# Altium integrated library Integrated_jp.IntLib: 316 symbols (part 2 of 3) (continued)
## REG_LM2576HVSX-12
designator U?, comment LM2576HVSX-12
Reductor Reguladores de conmutación IC Positivo Fija 12V 1 Salida 3A TO-263-6, D2PAK (5 conductores + pestaña), TO-263CA; Digi_Key_Part_Number: 296-35394-1-ND; Price: 7,26; Link: https://www.digikey.com/es/products/detail/texas-instruments/LM2576HVSX-12-NOPB/366785; LCSC Part: C18197844; Price JLCPCB: 0,92; Mouser Part: 926-LM2576HVSX12NOPB; ComponentLink1Description: IC REG BUCK 12V 3A TO263; ComponentLink1URL: https://www.digikey.com/es/products/detail/texas-instruments/LM2576HVSX-12-NOPB/366785; Value: LM2576HVSX-12
footprint TO-263-5-M
pins: 1 VIN (in), 2 OUT (out), 3 GND (power), 4 FB (in), 5 ~{ON!/OFF} (in), 6 GND (power)

## REG_LM2576HVSX-ADJ
designator U?, comment LM2576HVSX-ADJ/NOPB
Reductor Reguladores de conmutación IC Positivo Ajuste 1.23V 1 Salida 3A TO-263-6, D2PAK (5 conductores + pestaña), TO-263CA; Digi_Key_Part_Number: LM2576HVSX-ADJ/NOPBCT-ND; Price: 7,26; Link: https://www.digikey.com/es/products/detail/texas-instruments/LM2576HVSX-ADJ-NOPB/3526858; ComponentLink1Description: IC REG BUCK ADJ 3A TO263; ComponentLink1URL: https://www.digikey.com/es/products/detail/texas-instruments/LM2576HVSX-ADJ-NOPB/3526858; LCSC Part: C347423; Mouser Part: 926-LM2596S-ADJ/NOPB; Price JLCPCB: 0,57; Value: LM2576HVSX-ADJ/NOPB
footprint TO-263-5-M
pins: 1 VIN (in), 2 OUT (out), 3 GND (power), 4 FB (in), 5 ~{ON!/OFF} (in), 6 GND (power)

## REG_LM2576S-ADJ/NOPB
designator U?, comment value LM2576S-ADJ  (hidden comment: LM2576S-ADJ/NOPB)
Buck Switching Regulator IC Positive Adjustable 1 Output 3A TO-263-6, D2PAK (5 Leads + Tab), TO-263BA; Digi_Key_Part_Number: LM2576S-ADJ/NOPB-ND; MF: Texas Instruments; Package: TO-263-5 Texas Instruments; DigiKey-Purchase-URL: https://snapeda.com/shop?store=DigiKey&id=214896; MP: LM2576S-ADJ/NOPB; Price: None; Texas_Instruments-Purchase-URL: https://snapeda.com/shop?store=Texas+Instruments&id=214896; Availability: Unavailable; SnapEDA_Link: https://www.snapeda.com/parts/LM2576S-ADJ/NOPB/Texas%20Instruments/view-part/214896/?ref=snap; Mouser-Purchase-URL: https://snapeda.com/shop?store=Mouser&id=214896; Link: https://www.digikey.com/en/products/detail/texas-instruments/LM2576S-ADJ-NOPB/363655?s=N4IgTCBcDaIDIFkwFYDsA2AygWgIIBEApAegDkB5ABQCEQBdAXyA; ComponentLink1Description: LM2576S-ADJ; ComponentLink1URL: https://www.digikey.com/en/products/detail/umw/LM2576S-ADJ/16842220
footprint TO-263-5-M
pins: 1 VIN (in), 2 OUT (out), 3 GND (power), 4 FB (in), 5 ~{ON!/OFF} (in), 6 GND (power)

## REG_LM2594HVMX-12NOPB
designator U?, comment LM2594HVMX-12/NOPB  (value not drawn)
Reductor Reguladores de conmutación IC Positivo Fija 12V 1 Salida 500mA 8-SOIC (0.154", 3.90mm de ancho); Digi_Key_Part_Number: 296-35397-1-ND; ComponentLink1Description: IC REG BUCK 12V 500MA 8SOIC; ComponentLink1URL: https://www.digikey.com/es/products/detail/texas-instruments/LM2594HVMX-12-NOPB/366820; Link: https://www.digikey.com/es/products/detail/texas-instruments/LM2594HVMX-12-NOPB/366820; Value: *; Price: 5,29; LCSC Part: *; Mouser Part: *; Price JLCPCB: *
footprint M08A
pins: 1 NC, 2 NC, 3 NC, 4 FB, 5 ~ON~/OFF, 6 GND, 7 VIN (in), 8 VOUT (out)

## REG_LM2596SX-ADJNOPB
designator U?, comment LM2596SX-ADJ/NOPB
Buck Switching Regulator IC Positive Adjustable 1.2V 1 Output 3A TO-263-6, D2PAK (5 Leads + Tab), TO-263BA; Digi_Key_Part_Number: 296-35399-1-ND; ComponentLink1Description: LM2596SX-ADJ/NOPB; ComponentLink1URL: https://www.digikey.com/en/products/detail/texas-instruments/LM2596SX-ADJ-NOPB/366833; Link: https://www.digikey.com/en/products/detail/texas-instruments/LM2596SX-ADJ-NOPB/366833; Price: 5,76; JLCPCB Part: C29781; Value: LM2596SX-ADJ/NOPB
footprint TO-263-5-M
pins: 1 VIN (power), 2 OUTPUT (power), 3 GND (power), 4 FEEDBACK (in), 5 ON_OFF_N (in), 6 TAB (power)

## REG_LMR54410DBVR
designator U?, comment LMR54410DBVR
Buck Switching Regulator IC Positive Adjustable 0.8V 1 Output 1A SOT-23-6; Digi_Key_Part_Number: 296-LMR54410DBVRCT-ND; ComponentLink1Description: IC REG BUCK ADJ 1A SOT23-6; ComponentLink1URL: https://www.digikey.com/en/products/detail/texas-instruments/LMR54410DBVR/15853926; Link: https://www.digikey.com/en/products/detail/texas-instruments/LMR54410DBVR/15853926; Price: 1,06; LCSC Part: C3200265; Mouser Part: *; Price JLCPCB: 0,38; Value: LMR54410DBVR
footprint SOT95P280X145-6N
pins: 1 CB (power), 2 GND (power), 3 FB (in), 4 EN (in), 5 VIN (in), 6 SW (out)

## REG_LT1129IS8-3.3_Lineal_8_Soic
designator U?, comment Supplier Part Number 1: LT1129IS8-3.3#PBF-ND  (hidden comment: MIC5209-3.3YM-CT-ND)
PMIC - reguladores de voltaje lineal Positivo Fija 1 Salida 700mA 8-SO; Value: LT1129IS8-3.3; MF: Linear Technology/Analog; MP: LT1129IS8-3.3#PBF; Price: None; Package: SOIC-8 Linear Technology; Purchase-URL: https://pricing.snapeda.com/search/part/LT1129IS8-3.3#PBF/?ref=eda; SnapEDA_Link: https://www.snapeda.com/parts/LT1129IS8-3.3%23PBF/Analog%20Devices/view-part/1215396/?ref=snap; Availability: Good; Check_prices: https://www.snapeda.com/parts/LT1129IS8-3.3%23PBF/Analog%20Devices/view-part/1215396/?ref=eda; Supplier 1: Digi-Key; Link: https://www.digikey.com/en/products/detail/microchip-technology/MIC5209-3-3YM-TR/7916551; Digi_Key_Part_Number: MIC5209-3.3YM-CT-ND; ComponentLink1Description: IC REG LINEAR 3.3V 500MA 8SOIC; ComponentLink1URL: https://www.digikey.com/en/products/detail/microchip-technology/MIC5209-3-3YM-TR/7916551
footprint SO-8_S
pins: 1 OUTPUT (out), 2 SENSE/ADJ, 3 GND_2 (power), 4 NC, 5 *SHDN, 6 GND_3 (power), 7 GND (power), 8 VIN (in)

## REG_LT1528CQ_Lineal
designator U?, comment LT1529IQ-3.3#PBF-ND  value LT1529IQ
PMIC - reguladores de voltaje lineal Positivo Ajuste 1 Salida 3A 5-DDPAK; Digi_Key_Part_Number: LT1529IQ#PBF-ND; Supplier 1: Digi-Key; Supplier Part Number 1: LT1529IQ#PBF-ND; Link: https://www.digikey.com/es/products/detail/LT1529IQ%2523PBF/LT1529IQ%2523PBF-ND/963664?utm_campaign=buynow&utm_medium=aggregator&curr=usd&utm_source=octopart; ComponentLink1Description: IC REG LINEAR 3.3V 3A 5DDPAK; ComponentLink1URL: https://www.digikey.com/es/products/detail/analog-devices-inc/lt1529iq-3-3-pbf/963661
footprint DD PAK
pins: 1 VOUT, 2 Sense, 3 GND, 4 ~{SHDN}, 5 VIN, 6 tab

## REG_MIC29301-5.0WU-TR_LINEAL
designator U?, comment MIC29301-5.0WU-TR
PMIC - reguladores de voltaje lineal Positivo Fija 1 Salida 3A TO-263-5; Mfr_Name: Microchip; Digi_Key_Part_Number: MIC29301-5.0WU-CT-ND; RefDes: RefDes; Type: Type; Link: https://www.digikey.com/es/products/detail/microchip-technology/MIC29301-5-0WU-TR/9450534; ComponentLink1Description: MIC29301-5.0WU-TR; ComponentLink1URL: https://www.digikey.com/es/products/detail/microchip-technology/MIC29301-5-0WU-TR/9450534; Value: MIC29301-5.0WU-TR
footprint TO-263-5-M
pins: 1 EN (in), 2 IN (in), 3 GND (power), 4 OUT (out), 5 FLAG (out), 6

## REG_MIC29302AWD
designator IC?, comment MIC29302AWD
PMIC - reguladores de voltaje lineal Positivo Ajuste 1 Salida 3A TO-252-5; Manufacturer_Name: Microchip; Digi_Key_Part_Number: 576-4058-5-ND; Datasheet Link: http://www.microchip.com/mymicrochip/filehandler.aspx?ddocname=en580808; Height: 2.451mm; Manufacturer_Part_Number: MIC29302AWD; Mouser Part Number: 998-MIC29302AWD; Mouser Price/Stock: https://www.mouser.co.uk/ProductDetail/Microchip-Technology/MIC29302AWD?qs=kh6iOki%2FeLHCfDEMcJUwRg%3D%3D; Arrow Part Number: MIC29302AWD; Arrow Price/Stock: https://www.arrow.com/en/products/mic29302awd/microchip-technology?region=nac; ComponentLink1Description: MIC29302AWD; ComponentLink1URL: https://www.digikey.com/es/products/detail/microchip-technology/MIC29302AWD/3654290; Link: https://www.digikey.com/es/products/detail/microchip-technology/MIC29302AWD/3654290; Value: MIC29302AWD
footprint MIC29302AWD
pins: 1 EN, 2 IN, 3 GND, 4 OUT, 5 ADJ, 6 TAB

## REG_TL1963A-33DCYR_3.3V_Lineal
designator U?, comment 296-24897-1-ND  (value not drawn)
Linear Voltage Regulator IC Positive Fixed 1 Output 1.5A SOT-223-4; MP: TL1963A-33DCYR; Value: *; Availability: Unavailable; Package: None; Price: None; ComponentLink1Description: IC REG LINEAR 3.3V 1.5A SOT223-4; ComponentLink1URL: https://www.digikey.com/en/products/detail/texas-instruments/TL1963A-33DCYR/2118656?s=N4IgTCBcDaICoBkCMBOAbAZgIIFoMYBEBhATQCUQBdAXyA; Digi_Key_Part_Number: 296-24897-1-ND; Link: https://www.digikey.com/en/products/detail/texas-instruments/TL1963A-33DCYR/2118656?s=N4IgTCBcDaICoBkCMBOAbAZgIIFoMYBEBhATQCUQBdAXyA
footprint VREG_TL1963A-33DCYR
pins: 1 IN (in), 2 GND_2 (power), 3 OUT (out), 4 GND_4 (power)

## REG_TL2575-3.3V
designator U?, comment Supplier Part Number 1: MIC4575-3.3WU-TR-ND  Supplier Part Number 2: LM2575HVS-3.3/NOPB-ND  (hidden comment: 296-21828-1-ND)
Buck, Buck-Boost Switching Regulator IC Positive Fixed 3.3V 1 Output 1.7A (Switch) TO-263-6, D²Pak (5 Leads + Tab), TO-263BA; Manufacturer_Part_Number: MIC4575-5.0WU-TR; Manufacturer: Microchip Micrel; Vendor: Microchip; Built_By: EMA_Jessica; Output Voltage: 5V; Max Output Current: 1A; Number of Outputs: 1; Efficiency: 77%; Min Input Voltage: 4V; Max Input Voltage: 24V; Switching Frequency: 200kHz; Synchronous Rectifier: No; Copyright: Copyright (C) 2018 Accelerated Designs. All rights reserved; RefDes: RefDes; Type: DEV; Value: Value; Manufacturer Part Number: MIC4575-5.0WU-TR; Mount: Surface Mount; Case/Package: TO-263-5; Min Operating Temperature: -40°C; Max Operating Temperature: 85°C; Packaging: Tape and Reel; Package Quantity: 750; Output Current: 1.7A; Min Output Voltage: 5V; Topology: Buck-Boost; Output Type: Fixed; Output Configuration: Positive; Lead Free: Lead Free; Supplier 1: Digi-Key; Supplier 2: Digi-Key; ComponentLink1Description: IC REG BUCK 3.3V 1A DDPAK; ComponentLink1URL: https://www.digikey.com/en/products/detail/texas-instruments/TL2575-33IKTTR/1629209; Digi_Key_Part_Number: 296-21828-1-ND; Link: https://www.digikey.com/en/products/detail/texas-instruments/TL2575-33IKTTR/1629209
footprint TO-263-5-M
pins: 1 VIN (in), 2 SW (out), 3 GND (power), 4 FB (in), 5 SHDN, 6

## REG_TLV75533PDBVR_3.3V
designator U?, comment TLV75533PDBVR  (value not drawn)
Linear Voltage Regulator IC Positive Fixed 1 Output 500mA SOT-23-5; Digi_Key_Part_Number: 296-50411-1-ND; Value: TLV75533PDBVR; ComponentLink1Description: IC REG LINEAR 3.3V 500MA SOT23-5; ComponentLink1URL: https://www.digikey.com/en/products/detail/texas-instruments/TLV75533PDBVR/9356541; Link: https://www.digikey.com/en/products/detail/texas-instruments/TLV75533PDBVR/9356541; Price: 0,32; Price JLCPCB: 0,11; Mouser Part: 595-TLV75533PDBVR; LCSC Part: C723789
footprint SOT95P280X145-5N
pins: 1 IN (in), 2 GND (power), 3 EN (in), 5 OUT (out)

## RELAY-5V-1A-10MM-UA2-5NU
designator K?, comment value UA2-5NU  (hidden comment: UA2-5SNU)
General Purpose Relay DPDT (2 Form C) Through Hole; Digi_Key_Part_Number: UA2-5NU-ND; Price: 2,03; Link: https://www.digikey.com/en/products/detail/kemet/UA2-5NU/5502071?s=N4IgTCBcDaIAQFUCCYC0BWAcgkBdAvkA; ComponentLink1Description: RELAY GENERAL PURPOSE DPDT 1A 5V; ComponentLink1URL: https://www.digikey.com/en/products/detail/kemet/UA2-5NU/5502071?s=N4IgTCBcDaIAQFUCCYC0BWAcgkBdAvkA
footprint RELAY_KEMET_UA2
pins: 1 COIL1, 2 NC1, 3 COM1, 4 NO1, 5 NO2, 6 COM2, 7 NC2, 8 COIL2

## RelAY-DPDT-TIPO-C-2A-12V-LITTLE
designator U?, comment AGQ20012
Telecomunicaciones Relé DPDT (2 Forma C) Orificio pasante; Mfr_Name: Panasonic; Digi_Key_Part_Number: 255-1358-5-ND; RefDes: RefDes; Type: Type; ComponentLink1Description: RELAY TELECOM DPDT 2A 12V; ComponentLink1URL: https://www.digikey.com/es/products/detail/panasonic-electric-works/AGQ20012/510127; Link: https://www.digikey.com/es/products/detail/panasonic-electric-works/AGQ20012/510127; Price: 1,91; Value: AGQ20012
footprint RELAY_AGQ_PAN
pins: 1, 2 5, 3, 4, 5 3, 6, 7 8, 8 2

## Relay-DPDT_8A_12V
designator K?, comment value 7-1415538-8  (hidden comment: PB2015-ND)
Relé Propósito general DPDT (2 Forma C) 12 VCC Espiral Orificio pasante Relé Propósito general DPDT (2 Forma C) Orificio pasante; Manufacturer: TE Connectivity; Voltage Rating (AC): 400V; Contact Current Rating: 8A; Coil Resistance: 360R; Coil Power: 400mW; Coil Current: 33.3mA; Operate Time: 8ms; Dropout Voltage: 1.2V; Coil Voltage (DC): 12V; Contact Voltage Rating (AC): 250V; Approvals: UL,CSA,VDE; Published: 24-Mar-1999; LatestRevisionDate: 17-Jul-2002; LatestRevisionNote: Re-released for DXP Platform.; PackageReference: DIP-P8; Publisher: Altium Limited; PackageDescription: Relay; 8 Leads; Supplier 1: Digi-Key; Manufacturer Part Number: 7-1415538-8; Stock 1: 10430; Pricing 1: 1=4.01, 10=3.758, 25=3.34, 50=3.173, 100=3.006, 250=2.672, 500=2.505, 1000=2.338 (USD); Mount: PCB,Through Hole; Case/Package: DIP; Number of Pins: 8; Weight: 13g; Contact Material: Silver; Min Operating Temperature: -40°C; Max Operating Temperature: 85°C; Max Voltage Rating (AC): 400V; Packaging: Carton; Termination: PCB; Throw Configuration: DPDT; Current Rating: 8A; Voltage Rating (DC): 12V; Length: 29mm; Height: 15.7mm; Depth: 12.7mm; Width: 12.7mm; Radiation Hardening: No; ELV: Compliant; ComponentLink1Description: RELAY GEN PURPOSE DPDT 8A 12V; ComponentLink1URL: https://www.digikey.com/es/products/detail/7-1415538-8/PB2015-ND/4959322?utm_campaign=buynow&utm_medium=aggregator&curr=usd&utm_source=octopart; Digi_Key_Part_Number: PB2015-ND; Link: https://www.digikey.com/es/products/detail/7-1415538-8/PB2015-ND/4959322?utm_campaign=buynow&utm_medium=aggregator&curr=usd&utm_source=octopart; Supplier Part Number 1: PB2015-ND; Price: 5,05
footprint RELAY_G5V-2
pins: 11 CC, 12 NC, 14 NA, 21 CC, 22 NC, 24 NA, A1 "A1", A2 "A2"

## Relay_10mm_2A_little
designator K?, comment 6-1462037-6  (value not drawn)
RELAY TELECOM DPDT 2A 12VDC; Mfr_Name: TE Connectivity; Digi_Key_Part_Number: PB2085-ND; Copyright: Copyright (C) 2022 Ultra Librarian. All rights reserved.; Manufacturer_Part_Number: 6-1462037-6; RefDes: RefDes; Type: DEV; Supplier 1: Digi-Key; Supplier 2: Digi-Key; Link: https://www.digikey.com/es/products/detail/te-connectivity-potter-brumfield-relays/6-1462037-6/2398972?s=N4IgTCBcDaIAoCEwAYAcBWAtAOQCIgF0BfIA; ComponentLink1Description: RELAY TELECOM DPDT 2A 12V; ComponentLink1URL: https://www.digikey.com/es/products/detail/te-connectivity-potter-brumfield-relays/6-1462037-6/2398972?s=N4IgTCBcDaIGwFoCMAWOYAMBmA7AuIAugL5A; Supplier Part Number 1: 6-1462037-6-ND; Supplier Part Number 2: PB2081-ND; Value: 6-1462037-6; Price: 3,28
footprint RELAY8_THTSTD_TEC -little
pins: 1, 2, 3, 4, 5, 6, 7, 8

## Relay_TX2-12V
designator U?, comment TX2-12V
Telecomunicaciones Relé DPDT (2 Forma C) Orificio pasante; Mfr_Name: Panasonic; Digi_Key_Part_Number: 255-1032-5-ND; RefDes: RefDes; Type: Type; Link: https://www.digikey.com/es/products/detail/panasonic-electric-works/TX2-12V/251804; Price: 2,04; ComponentLink1Description: RELAY TELECOM DPDT 2A 12V; ComponentLink1URL: https://www.digikey.com/es/products/detail/panasonic-electric-works/TX2-12V/251804; Value: TX2-12V
footprint RELAY_TX2_PAN
pins: 1, 3, 4, 5, 8, 9, 10, 12

## Res1_00_0805
designator R?, comment value 0  (hidden comment: NRC10ZOTRF)
0 Ohms Puente 0.125W, 1/8W Resistencia en microprocesador 0805 (2012 métrico) AEC-Q200 automotriz Película gruesa; Digi_Key_Part_Number: 4988-NRC10ZOTRFCT-ND; Link: https://www.digikey.com/es/products/detail/nic-components-corp/NRC10ZOTRF/18895961; Price: 0,10; ComponentLink1Description: 0 Ohms Puente 0.125W, 1/8W RES SMT08050M2A; ComponentLink1URL: https://www.digikey.com/es/products/detail/nic-components-corp/NRC10ZOTRF/18895961; LCSC Part: C17477; Mouser Part: 303-0805W8F0000T5E; Price JLCPCB: 0,01
footprint RES0805
pins: 1, 2

## Res1_00_PUENTE
designator R?, comment RMCF1206ZT0R00CT-ND  value 00
RES 0 OH0 Ohms Puente Resistencia en microprocesador 1206 (3216 métrico) AEC-Q200 automotriz Película gruesaM JUMPER 1/4W 1206; Manufacturer: Panasonic; Manufacturer Part Number: ERJ-8ENF5232V; Resistance: 52.3kR; Tolerance: 1%; Power Rating: 250mW; Voltage Rating: 200V; Temperature Coefficient: 100ppm/°C; Published: 8-Jun-2000; LatestRevisionDate: 17-Jul-2002; LatestRevisionNote: Re-released for DXP Platform.; PackageReference: AXIAL-0.3; Publisher: Altium Limited; PackageDescription: Axial Device, Thru-Hole; 2 Leads; 0.3 in Pin Spacing; Mount: Surface Mount; Case/Package: 1206; Case Code (Imperial): 1206; Case Code (Metric): 3216; Contact Plating: Tin; Min Operating Temperature: -55°C; Max Operating Temperature: 155°C; Packaging: Tape and Reel; Package Quantity: 1; Composition: Thick Film; Number of Terminations: 2; Max Power Dissipation: 250mW; Voltage Rating (DC): 200V; Features: Automotive AEC-Q200; Military Standard: Not; Termination: SMD/SMT; Length: 3.2mm; Height: 0.028inch; Width: 1.6mm; Depth: 1.6mm; REACH SVHC: Yes; ComponentLink1URL: http://www.farnell.com/datasheets/1678782.pdf?src-supplier=Farnell; ComponentLink1Description: http://www.farnell.com/datasheets/1678782.pdf?src-supplier=Farnell; ComponentLink2URL: http://industrial.panasonic.com/www-data/pdf/AOA0000/AOA0000CE2.pdf?src-supplier=Mouser; ComponentLink2Description: http://industrial.panasonic.com/www-data/pdf/AOA0000/AOA0000CE2.pdf?src-supplier=Mouser; Supplier 1: Digi-Key; Digi_Key_Part_Number: RMCF1206ZT0R00CT-ND; Link: https://www.digikey.com/es/products/detail/RMCF1206ZT0R00/RMCF1206ZT0R00DKR-ND/1943741?utm_campaign=buynow&utm_medium=aggregator&curr=usd&utm_source=octopart; ComponentLink3Description: RES 0 OHM JUMPER 1/4W 1206; ComponentLink3URL: https://www.digikey.com/es/products/detail/RMCF1206ZT0R00/RMCF1206ZT0R00DKR-ND/1943741?utm_campaign=buynow&utm_medium=aggregator&curr=usd&utm_source=octopart; Price: 0,10; Supplier Part Number 1: RMCF1206ZT0R00DKR-ND
footprint RES1206
pins: 1, 2

## Res1_1K
designator R?, comment value 1K  (hidden comment: 311-1.00KFRCT-ND)
RES 1K OH1 kOhms ±1% 0.25W, 1/4W Resistencia en microprocesador 1206 (3216 métrico) Resistente a la humedad Película gruesaM 1% 1/4W 1206; Manufacturer: Panasonic; Manufacturer Part Number: ERJ-8ENF5232V; Resistance: 52.3kR; Power Rating: 250mW; Voltage Rating: 200V; Temperature Coefficient: 100ppm/°C; Published: 8-Jun-2000; LatestRevisionDate: 17-Jul-2002; LatestRevisionNote: Re-released for DXP Platform.; PackageReference: AXIAL-0.3; Publisher: Altium Limited; PackageDescription: Axial Device, Thru-Hole; 2 Leads; 0.3 in Pin Spacing; Mount: Surface Mount; Case/Package: 1206; Case Code (Imperial): 1206; Case Code (Metric): 3216; Contact Plating: Tin; Min Operating Temperature: -55°C; Max Operating Temperature: 155°C; Tolerance: 1%; Packaging: Tape and Reel; Package Quantity: 1; Composition: Thick Film; Number of Terminations: 2; Max Power Dissipation: 250mW; Voltage Rating (DC): 200V; Features: Automotive AEC-Q200; Military Standard: Not; Termination: SMD/SMT; Length: 3.2mm; Height: 0.028inch; Width: 1.6mm; Depth: 1.6mm; REACH SVHC: Yes; ComponentLink1URL: http://www.farnell.com/datasheets/1678782.pdf?src-supplier=Farnell; ComponentLink1Description: http://www.farnell.com/datasheets/1678782.pdf?src-supplier=Farnell; ComponentLink2URL: http://industrial.panasonic.com/www-data/pdf/AOA0000/AOA0000CE2.pdf?src-supplier=Mouser; ComponentLink2Description: http://industrial.panasonic.com/www-data/pdf/AOA0000/AOA0000CE2.pdf?src-supplier=Mouser; Supplier 1: Digi-Key; Link: https://www.digikey.com/es/products/detail/yageo/RC1206FR-071KL/728387?s=N4IgTCBcDaIMwEYEFoEDoAMGDSAxASgMIAqyAcgCIgC6AvkA; Digi_Key_Part_Number: 311-1.00KFRCT-ND; ComponentLink3Description: RES 1K OHM 1% 1/4W 1206; ComponentLink3URL: https://www.digikey.com/es/products/detail/yageo/RC1206FR-071KL/728387?s=N4IgTCBcDaIMwEYEFoEDoAMGDSAxASgMIAqyAcgCIgC6AvkA; Price: 0,10; Supplier Part Number 1: 13-RC1206FR-132K2LDKR-ND
footprint RES1206
pins: 1, 2

## Res1_1K5
designator R?, comment value 1K5  (hidden comment: CRCW12061K50FKEAC)
1.5 kOhms ±1% 0.25W, 1/4W Resistencia en microprocesador 1206 (3216 métrico) Película gruesa; Manufacturer: Panasonic; Manufacturer Part Number: ERJ-8ENF5232V; Digi_Key_Part_Number: 541-4184-1-ND; Resistance: 52.3kR; Power Rating: 250mW; Voltage Rating: 200V; Temperature Coefficient: 100ppm/°C; Published: 8-Jun-2000; LatestRevisionDate: 17-Jul-2002; LatestRevisionNote: Re-released for DXP Platform.; PackageReference: AXIAL-0.3; Publisher: Altium Limited; PackageDescription: Axial Device, Thru-Hole; 2 Leads; 0.3 in Pin Spacing; Mount: Surface Mount; Case/Package: 1206; Case Code (Imperial): 1206; Case Code (Metric): 3216; Contact Plating: Tin; Min Operating Temperature: -55°C; Max Operating Temperature: 155°C; Tolerance: 1%; Packaging: Tape and Reel; Package Quantity: 1; Composition: Thick Film; Number of Terminations: 2; Max Power Dissipation: 250mW; Voltage Rating (DC): 200V; Features: Automotive AEC-Q200; Military Standard: Not; Termination: SMD/SMT; Length: 3.2mm; Height: 0.028inch; Width: 1.6mm; Depth: 1.6mm; REACH SVHC: Yes; Supplier 1: Digi-Key; Link: https://www.digikey.com/es/products/detail/vishay-dale/CRCW12061K50FKEAC/7928606; ComponentLink1Description: CRCW12061K50FKEAC; ComponentLink1URL: https://www.digikey.com/es/products/detail/vishay-dale/CRCW12061K50FKEAC/7928606; Supplier Part Number 1: 13-RC1206FR-132K2LDKR-ND; Price: 0,10
footprint RES1206
pins: 1, 2

## Res1_1K5_0805
designator R?, comment value 1K5  (hidden comment: RNCP0805FTD1K50)
1.5 kOhms ±1% 0.25W, 1/4W Resistencia en microprocesador 0805 (2012 métrico) Anti-azufre Película delgada; Digi_Key_Part_Number: RNCP0805FTD1K50CT-ND; Link: https://www.digikey.com/es/products/detail/stackpole-electronics-inc/RNCP0805FTD1K50/2240233; Price: 0,10; ComponentLink1Description: RES 1.5K OHM 1% 1/4W 0805; ComponentLink1URL: https://www.digikey.com/es/products/detail/stackpole-electronics-inc/RNCP0805FTD1K50/2240233; LCSC Part: C160067; Mouser Part: 708-RNCP0805FTD1K50; Price JLCPCB: 0,01
footprint RES0805
pins: 1, 2

## Res1_1K_0805
designator R?, comment value 1K  (hidden comment: RK73B2ATTD102J)
1 kOhms ±5% 0.25W, 1/4W Resistencia en microprocesador 0805 (2012 métrico) AEC-Q200 automotriz Película gruesa; Digi_Key_Part_Number: 2019-RK73B2ATTD102JCT-ND; Link: https://www.digikey.com/es/products/detail/koa-speer-electronics-inc/RK73B2ATTD102J/10236529; Price: 0,10; ComponentLink1Description: RES 1K OHM 5% 1/4W 0805; ComponentLink1URL: https://www.digikey.com/es/products/detail/koa-speer-electronics-inc/RK73B2ATTD102J/10236529; LCSC Part: C873867; Price JLCPCB: 0,01; Mouser Part: 660-RK73B2ATTD102J
footprint RES0805
pins: 1, 2

## Res1_1M
designator R?, comment value 1M  (hidden comment: YAG2022CT-ND)
RES SMD 1M OHM 0.1% 1/4W 1206; Manufacturer: Panasonic; Manufacturer Part Number: ERJ-8ENF5232V; Resistance: 52.3kR; Tolerance: 1%; Power Rating: 250mW; Voltage Rating: 200V; Temperature Coefficient: 100ppm/°C; Published: 8-Jun-2000; LatestRevisionDate: 17-Jul-2002; LatestRevisionNote: Re-released for DXP Platform.; PackageReference: AXIAL-0.3; Publisher: Altium Limited; PackageDescription: Axial Device, Thru-Hole; 2 Leads; 0.3 in Pin Spacing; Mount: Surface Mount; Case/Package: 1206; Case Code (Imperial): 1206; Case Code (Metric): 3216; Contact Plating: Tin; Min Operating Temperature: -55°C; Max Operating Temperature: 155°C; Packaging: Tape and Reel; Package Quantity: 1; Composition: Thick Film; Number of Terminations: 2; Max Power Dissipation: 250mW; Voltage Rating (DC): 200V; Features: Automotive AEC-Q200; Military Standard: Not; Termination: SMD/SMT; Length: 3.2mm; Height: 0.028inch; Width: 1.6mm; Depth: 1.6mm; REACH SVHC: Yes; ComponentLink1URL: http://www.farnell.com/datasheets/1678782.pdf?src-supplier=Farnell; ComponentLink1Description: http://www.farnell.com/datasheets/1678782.pdf?src-supplier=Farnell; ComponentLink2URL: http://industrial.panasonic.com/www-data/pdf/AOA0000/AOA0000CE2.pdf?src-supplier=Mouser; ComponentLink2Description: http://industrial.panasonic.com/www-data/pdf/AOA0000/AOA0000CE2.pdf?src-supplier=Mouser; Supplier 1: Digi-Key; Digi_Key_Part_Number: YAG2022CT-ND; Link: https://www.digikey.com/es/products/detail/RT1206BRD071ML/YAG2022DKR-ND/5140399?utm_campaign=buynow&utm_medium=aggregator&curr=usd&utm_source=octopart; Supplier Part Number 1: YAG2022DKR-ND; Price: 0,10
footprint RES1206
pins: 1, 2

## Res1_2K2
designator R?, comment value 2K2  (hidden comment: 311-2.20KFRCT-ND)
RES 2.2K OHM 1% 1/4W 1206; Link: https://www.digikey.com/es/products/detail/RC1206FR-072K2L/311-2.20KFRDKR-ND/734518?utm_campaign=buynow&utm_medium=aggregator&curr=usd&utm_source=octopart; Digi_Key_Part_Number: 311-2.20KFRCT-ND; ComponentLink3Description: RES 2.2K OHM 1% 1/4W 1206; ComponentLink3URL: https://www.digikey.com/es/products/detail/yageo/RC1206FR-072K2L/728624?s=N4IgTCBcDaIMwEYEFowDowAYDSAxASgMIAqyAcgCIgC6AvkA; Price: 0,10; JLCPCB Part: *
footprint RES1206
pins: 1, 2

## Res1_2K2_0805
designator R?, comment value 2k2  (hidden comment: SR0805JR-7W2K2L)
2.2 kOhms ±5% 0.25W, 1/4W Resistencia en microprocesador 0805 (2012 métrico) AEC-Q200 automotriz, protección contra impulsos Película gruesa; Digi_Key_Part_Number: YAG6054CT-ND; Link: https://www.digikey.com/es/products/detail/yageo/SR0805JR-7W2K2L/5948720; Price: 0,20; ComponentLink1Description: RES 2.2K OHM 5% 1/4W 0805; ComponentLink1URL: https://www.digikey.com/es/products/detail/yageo/SR0805JR-7W2K2L/5948720; LCSC Part: C17520; Price JLCPCB: 0,01; Mouser Part: 603-SR0805JR-7W2K2L
footprint RES0805
pins: 1, 2

## Res1_3K3
designator R?, comment value 3K3  (hidden comment: 311-3.3KERCT-ND)
3.3 kOhms ±5% 0.25W, 1/4W Chip Resistor 1206 (3216 Metric) Moisture Resistant Thick Film; Manufacturer: Panasonic; Manufacturer Part Number: ERJ-8ENF5232V; Resistance: 52.3kR; Tolerance: 1%; Power Rating: 250mW; Voltage Rating: 200V; Temperature Coefficient: 100ppm/°C; Published: 8-Jun-2000; LatestRevisionDate: 17-Jul-2002; LatestRevisionNote: Re-released for DXP Platform.; PackageReference: AXIAL-0.3; Publisher: Altium Limited; PackageDescription: Axial Device, Thru-Hole; 2 Leads; 0.3 in Pin Spacing; Mount: Surface Mount; Case/Package: 1206; Case Code (Imperial): 1206; Case Code (Metric): 3216; Contact Plating: Tin; Min Operating Temperature: -55°C; Max Operating Temperature: 155°C; Packaging: Tape and Reel; Package Quantity: 1; Composition: Thick Film; Number of Terminations: 2; Max Power Dissipation: 250mW; Voltage Rating (DC): 200V; Features: Automotive AEC-Q200; Military Standard: Not; Termination: SMD/SMT; Length: 3.2mm; Height: 0.028inch; Width: 1.6mm; Depth: 1.6mm; REACH SVHC: Yes; ComponentLink1URL: http://www.farnell.com/datasheets/1678782.pdf?src-supplier=Farnell; ComponentLink1Description: http://www.farnell.com/datasheets/1678782.pdf?src-supplier=Farnell; ComponentLink2URL: http://industrial.panasonic.com/www-data/pdf/AOA0000/AOA0000CE2.pdf?src-supplier=Mouser; ComponentLink2Description: http://industrial.panasonic.com/www-data/pdf/AOA0000/AOA0000CE2.pdf?src-supplier=Mouser; Supplier 1: Digi-Key; Digi_Key_Part_Number: 311-3.3KERCT-ND; Link: https://www.digikey.com/es/products/detail/RC1206JR-073K3L/311-3.3KERDKR-ND/735161?utm_campaign=buynow&utm_medium=aggregator&curr=usd&utm_source=octopart; ComponentLink3Description: RES 3.3K OHM 5% 1/4W 1206; ComponentLink3URL: https://www.digikey.com/es/products/detail/RC1206JR-073K3L/311-3.3KERDKR-ND/735161?utm_campaign=buynow&utm_medium=aggregator&curr=usd&utm_source=octopart; Supplier Part Number 1: 311-3.3KERDKR-ND; Price: 0,10
footprint RES1206
pins: 1, 2

## Res1_4k7
designator R?, comment value 4K7  (hidden comment: RMCF1206FT4K70CT-ND)
RES 4.7K OHM 1% 1/4W 1206; Manufacturer: Panasonic; Manufacturer Part Number: ERJ-8ENF5232V; Resistance: 52.3kR; Power Rating: 250mW; Voltage Rating: 200V; Temperature Coefficient: 100ppm/°C; Published: 8-Jun-2000; LatestRevisionDate: 17-Jul-2002; LatestRevisionNote: Re-released for DXP Platform.; PackageReference: AXIAL-0.3; Publisher: Altium Limited; PackageDescription: Axial Device, Thru-Hole; 2 Leads; 0.3 in Pin Spacing; Mount: Surface Mount; Case/Package: 1206; Case Code (Imperial): 1206; Case Code (Metric): 3216; Contact Plating: Tin; Min Operating Temperature: -55°C; Max Operating Temperature: 155°C; Tolerance: 1%; Packaging: Tape and Reel; Package Quantity: 1; Composition: Thick Film; Number of Terminations: 2; Max Power Dissipation: 250mW; Voltage Rating (DC): 200V; Features: Automotive AEC-Q200; Military Standard: Not; Termination: SMD/SMT; Length: 3.2mm; Height: 0.028inch; Width: 1.6mm; Depth: 1.6mm; REACH SVHC: Yes; ComponentLink1URL: http://www.farnell.com/datasheets/1678782.pdf?src-supplier=Farnell; ComponentLink1Description: http://www.farnell.com/datasheets/1678782.pdf?src-supplier=Farnell; ComponentLink2URL: http://industrial.panasonic.com/www-data/pdf/AOA0000/AOA0000CE2.pdf?src-supplier=Mouser; ComponentLink2Description: http://industrial.panasonic.com/www-data/pdf/AOA0000/AOA0000CE2.pdf?src-supplier=Mouser; Supplier 1: Digi-Key; Link: https://www.digikey.com/es/products/detail/RMCF1206FT4K70/RMCF1206FT4K70DKR-ND/1943603?utm_campaign=buynow&utm_medium=aggregator&curr=usd&utm_source=octopart; Digi_Key_Part_Number: RMCF1206FT4K70CT-ND; ComponentLink3Description: RES 4.7K OHM 1% 1/4W 1206; ComponentLink3URL: https://www.digikey.com/es/products/detail/stackpole-electronics-inc/RMCF1206FT4K70/1754008?s=N4IgTCBcDaIEoFkDCAxAjGADANhQFQBYBpAdkyTwFoA5AERAF0BfIA; Price: 0,10; Supplier Part Number 1: RMCF1206FT4K70DKR-ND
footprint RES1206
pins: 1, 2

## Res1_4K7_0805
designator R?, comment value 4K7  (hidden comment: CRCW08054K70FKEAC)
4.7 kOhms ±1% 0.125W, 1/8W Chip Resistor 0805 (2012 Metric) Thick Film; Digi_Key_Part_Number: 541-4131-1-ND; Link: https://www.digikey.com/en/products/detail/vishay-dale/CRCW08054K70FKEAC/7928553; Price: 0,10; ComponentLink1Description: RES 4.7K OHM 1% 1/8W 0805; ComponentLink1URL: https://www.digikey.com/en/products/detail/vishay-dale/CRCW08054K70FKEAC/7928553; LCSC Part: C844630; Mouser Part: 71-CRCW08054K70FKEAC; Price JLCPCB: 0,01
footprint RES0805
pins: 1, 2

## Res1_5K
designator R?, comment value 5K  (hidden comment: YAG5090CT-ND)
5 kOhms ±0.1% 0.25W, 1/4W Resistencia en microprocesador 1206 (3216 métrico) Película delgada; Manufacturer: Panasonic; Manufacturer Part Number: ERJ-8ENF5232V; Resistance: 52.3kR; Tolerance: 1%; Power Rating: 250mW; Voltage Rating: 200V; Temperature Coefficient: 100ppm/°C; Published: 8-Jun-2000; LatestRevisionDate: 17-Jul-2002; LatestRevisionNote: Re-released for DXP Platform.; PackageReference: AXIAL-0.3; Publisher: Altium Limited; PackageDescription: Axial Device, Thru-Hole; 2 Leads; 0.3 in Pin Spacing; Mount: Surface Mount; Case/Package: 1206; Case Code (Imperial): 1206; Case Code (Metric): 3216; Contact Plating: Tin; Min Operating Temperature: -55°C; Max Operating Temperature: 155°C; Packaging: Tape and Reel; Package Quantity: 1; Composition: Thick Film; Number of Terminations: 2; Max Power Dissipation: 250mW; Voltage Rating (DC): 200V; Features: Automotive AEC-Q200; Military Standard: Not; Termination: SMD/SMT; Length: 3.2mm; Height: 0.028inch; Width: 1.6mm; Depth: 1.6mm; REACH SVHC: Yes; ComponentLink1URL: http://www.farnell.com/datasheets/1678782.pdf?src-supplier=Farnell; ComponentLink1Description: http://www.farnell.com/datasheets/1678782.pdf?src-supplier=Farnell; ComponentLink2URL: http://industrial.panasonic.com/www-data/pdf/AOA0000/AOA0000CE2.pdf?src-supplier=Mouser; ComponentLink2Description: http://industrial.panasonic.com/www-data/pdf/AOA0000/AOA0000CE2.pdf?src-supplier=Mouser; Supplier 1: Digi-Key; Digi_Key_Part_Number: YAG5090CT-ND; Link: https://www.digikey.com/es/products/detail/yageo/RT1206BRD075KL/5936961?s=N4IgTCBcDaIJoEEDiBWADATjQYQCoFoA5AERAF0BfIA; ComponentLink3Description: RES SMD 5K OHM 0.1% 1/4W 1206; ComponentLink3URL: https://www.digikey.com/es/products/detail/yageo/RT1206BRD075KL/5936961?s=N4IgTCBcDaIJoEEDiBWADATjQYQCoFoA5AERAF0BfIA; Supplier Part Number 1: RT1206BRD075KL-ND; Price: 0,10
footprint RES1206
pins: 1, 2

## Res1_5K1_0805
designator R?, comment value 5K1  (hidden comment: RC0805JR-075K1L)
5.1 kOhms ±5% 0.125W, 1/8W Chip Resistor 0805 (2012 Metric) Moisture Resistant Thick Film; Digi_Key_Part_Number: 311-5.1KARCT-ND; Link: https://www.digikey.com/en/products/detail/yageo/RC0805JR-075K1L/728338; Price: 0,10; ComponentLink1Description: RES 5.1K OHM 5% 1/8W 0805; ComponentLink1URL: https://www.digikey.com/en/products/detail/yageo/RC0805JR-075K1L/728338; LCSC Part: C105874; Mouser Part: 603-RC0805JR-075K1L; Price JLCPCB: 0,01
footprint RES0805
pins: 1, 2

## Res1_5K9_0805
designator R?, comment value 5K9  (hidden comment: RC0805FR-075K9L)
5.9 kOhms ±1% 0.125W, 1/8W Resistencia en microprocesador 0805 (2012 métrico) Resistente a la humedad Película gruesa; Digi_Key_Part_Number: 311-5.90KCRCT-ND; Link: https://www.digikey.com/es/products/detail/yageo/RC0805FR-075K9L/728010; Price: 0,10; LCSC Part: C17730; Mouser Part: 603-RC0805FR-075K9L; Price JLCPCB: 0,01; ComponentLink1Description: RES 5.9K OHM 1% 1/8W 0805; ComponentLink1URL: https://www.digikey.com/es/products/detail/yageo/RC0805FR-075K9L/728010
footprint RES0805
pins: 1, 2

## Res1_10K
designator R?, comment value 10K  (hidden comment: A129822CT-ND)
10 kOhms ±1% 0.25W, 1/4W Resistencia en microprocesador 1206 (3216 métrico) AEC-Q200 automotriz, resistente a la humedad Película gruesa; Manufacturer: Panasonic; Manufacturer Part Number: ERJ-8ENF5232V; Resistance: 52.3kR; Power Rating: 250mW; Voltage Rating: 200V; Temperature Coefficient: 100ppm/°C; Published: 8-Jun-2000; LatestRevisionDate: 17-Jul-2002; LatestRevisionNote: Re-released for DXP Platform.; PackageReference: AXIAL-0.3; Publisher: Altium Limited; PackageDescription: Axial Device, Thru-Hole; 2 Leads; 0.3 in Pin Spacing; Mount: Surface Mount; Case/Package: 1206; Case Code (Imperial): 1206; Case Code (Metric): 3216; Contact Plating: Tin; Min Operating Temperature: -55°C; Max Operating Temperature: 155°C; Tolerance: 1%; Packaging: Tape and Reel; Package Quantity: 1; Composition: Thick Film; Number of Terminations: 2; Max Power Dissipation: 250mW; Voltage Rating (DC): 200V; Features: Automotive AEC-Q200; Military Standard: Not; Termination: SMD/SMT; Length: 3.2mm; Height: 0.028inch; Width: 1.6mm; Depth: 1.6mm; REACH SVHC: Yes; ComponentLink1URL: http://www.farnell.com/datasheets/1678782.pdf?src-supplier=Farnell; ComponentLink1Description: http://www.farnell.com/datasheets/1678782.pdf?src-supplier=Farnell; ComponentLink2URL: http://industrial.panasonic.com/www-data/pdf/AOA0000/AOA0000CE2.pdf?src-supplier=Mouser; ComponentLink2Description: http://industrial.panasonic.com/www-data/pdf/AOA0000/AOA0000CE2.pdf?src-supplier=Mouser; Supplier 1: Digi-Key; Link: https://www.digikey.com/es/products/detail/CRGCQ1206F10K/A129822DKR-ND/8578884?utm_campaign=buynow&utm_medium=aggregator&curr=usd&utm_source=octopart; Digi_Key_Part_Number: A129822CT-ND; ComponentLink3Description: RES 10K OHM 1% 1/4W 1206; ComponentLink3URL: https://www.digikey.com/es/products/detail/te-connectivity-passive-product/CRGCQ1206F10K/8576424?s=N4IgTCBcDaIIIEYwE4AcYwGEAqBaAcgCIgC6AvkA; Supplier Part Number 1: A129822DKR-ND; Price: 0,10
footprint RES1206
pins: 1, 2

## Res1_10K_0805
designator R?, comment value 10K  (hidden comment: ERJ-6GEYJ103V)
10 kOhms ±5% 0.125W, 1/8W Chip Resistor 0805 (2012 Metric) Automotive AEC-Q200 Thick Film; Digi_Key_Part_Number: P10KACT-ND; Link: https://www.digikey.com/en/products/detail/panasonic-electronic-components/ERJ-6GEYJ103V/83062; Price: 0,10; ComponentLink1Description: RES SMD 10K OHM 5% 1/8W 0805; ComponentLink1URL: https://www.digikey.com/en/products/detail/panasonic-electronic-components/ERJ-6GEYJ103V/83062; LCSC Part: C180849; Mouser Part: 667-ERJ-6GEYJ103V; Price JLCPCB: 0,01
footprint RES0805
pins: 1, 2

## Res1_22.1K_0805
designator R?, comment value 22.1K  (hidden comment: RMCF0805FT22K1)
22.1 kOhms ±1% 0.125W, 1/8W Chip Resistor 0805 (2012 Metric) Automotive AEC-Q200 Thick Film; Digi_Key_Part_Number: RMCF0805FT22K1CT-ND; Link: https://www.digikey.com/en/products/detail/stackpole-electronics-inc/RMCF0805FT22K1/1760211; Price: 0,10; LCSC Part: C17552; Price JLCPCB: 0,01; ComponentLink1Description: RES 22.1K OHM 1% 1/8W 0805; ComponentLink1URL: https://www.digikey.com/en/products/detail/stackpole-electronics-inc/RMCF0805FT22K1/1760211
footprint RES0805
pins: 1, 2

## Res1_22_0805
designator R?, comment value 22  (hidden comment: CR0805-JW-220ELF)
22 Ohms ±5% 0.125W, 1/8W Resistencia en microprocesador 0805 (2012 métrico) Resistente a la humedad Película gruesa; Digi_Key_Part_Number: 118-CR0805-JW-220ELFCT-ND; Link: https://www.digikey.com/es/products/detail/bourns-inc/CR0805-JW-220ELF/3785269; Price: 0,10; LCSC Part: C17561; Price JLCPCB: 0,01; ComponentLink1Description: RES SMD 22 OHM 5% 1/8W 0805; ComponentLink1URL: https://www.digikey.com/es/products/detail/bourns-inc/CR0805-JW-220ELF/3785269
footprint RES0805
pins: 1, 2

## Res1_22K
designator R?, comment value 22K  (hidden comment: 311-22KERCT-ND)
RES 22K OHM 5% 1/4W 1206; Manufacturer: Panasonic; Manufacturer Part Number: ERJ-8ENF5232V; Resistance: 52.3kR; Tolerance: 1%; Power Rating: 250mW; Voltage Rating: 200V; Temperature Coefficient: 100ppm/°C; Published: 8-Jun-2000; LatestRevisionDate: 17-Jul-2002; LatestRevisionNote: Re-released for DXP Platform.; PackageReference: AXIAL-0.3; Publisher: Altium Limited; PackageDescription: Axial Device, Thru-Hole; 2 Leads; 0.3 in Pin Spacing; Mount: Surface Mount; Case/Package: 1206; Case Code (Imperial): 1206; Case Code (Metric): 3216; Contact Plating: Tin; Min Operating Temperature: -55°C; Max Operating Temperature: 155°C; Packaging: Tape and Reel; Package Quantity: 1; Composition: Thick Film; Number of Terminations: 2; Max Power Dissipation: 250mW; Voltage Rating (DC): 200V; Features: Automotive AEC-Q200; Military Standard: Not; Termination: SMD/SMT; Length: 3.2mm; Height: 0.028inch; Width: 1.6mm; Depth: 1.6mm; REACH SVHC: Yes; ComponentLink1URL: http://www.farnell.com/datasheets/1678782.pdf?src-supplier=Farnell; ComponentLink1Description: http://www.farnell.com/datasheets/1678782.pdf?src-supplier=Farnell; ComponentLink2URL: http://industrial.panasonic.com/www-data/pdf/AOA0000/AOA0000CE2.pdf?src-supplier=Mouser; ComponentLink2Description: http://industrial.panasonic.com/www-data/pdf/AOA0000/AOA0000CE2.pdf?src-supplier=Mouser; Supplier 1: Digi-Key; Digi_Key_Part_Number: 311-22KERCT-ND; Link: https://www.digikey.com/es/products/detail/RC1206JR-0722KL/311-22KERDKR-ND/735148?utm_campaign=buynow&utm_medium=aggregator&curr=usd&utm_source=octopart; Supplier Part Number 1: 311-22KERDKR-ND; Price: 0,10
footprint RES1206
pins: 1, 2